# Altium footprint library MH_DA_THU_VIEN_16122016.PcbLib: 531 footprints (part 10 of 34)
Each footprint in its own frame and in the unit in brackets; x right, y up, seen from the top. Pads: shape width x height; smd on the part's side, far side on the other; paste and mask are expansions set on the pad; w line width, h text height; cw(c..) or ccw(c..) is an arc to the next point about the centre after c.
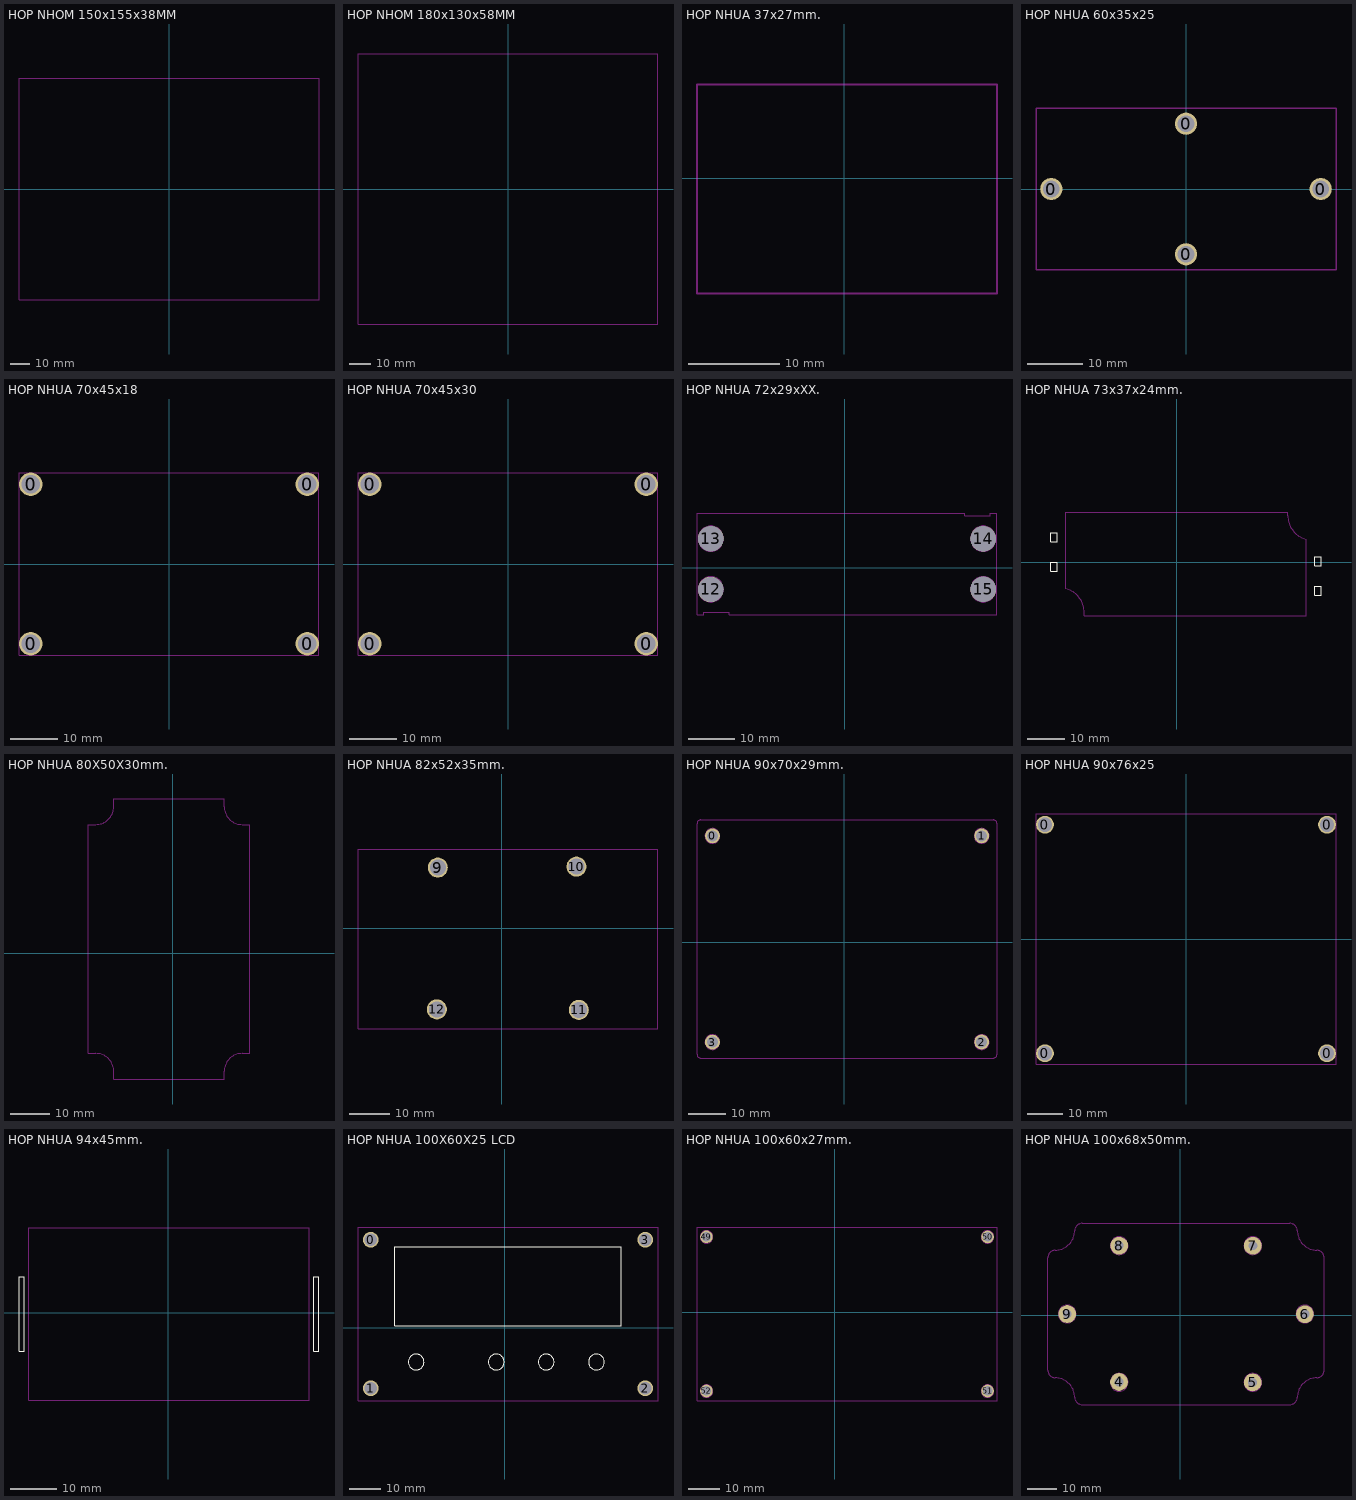
[diagram p9: the footprints below, top view; thin cyan lines are the x and y axes]

## HOP NHOM 150x155x38MM [mm]
Keep-Out Layer:
  lines w0.254: -76.5,-56.5 -76.5,56.5 76.5,56.5 76.5,-56.5 -76.5,-56.5

## HOP NHOM 180x130x58MM [mm]
Keep-Out Layer:
  lines w0.254: -71,-64 -71,64 71,64 71,-64 -71,-64

## HOP NHUA 37x27mm. [mm]
Keep-Out Layer:
  lines w0.254: -16.191,-12.659 16.809,-12.659 16.809,10.341 -16.191,10.341 -16.191,-12.659

## HOP NHUA 60x35x25 [mm]
pads (4):
  round 4 hole 3: 0(-24.25,0) 0(0,-11.75) 0(0,11.75) 0(24.25,0)
Keep-Out Layer:
  lines w0.254: -27,-14.5 -27,14.5 27,14.5 27,-14.5 -27,-14.5

## HOP NHUA 70x45x18 [mm]
pads (4):
  round 5 hole 4: 0(-29.5,-17) 0(-29.5,17) 0(29.5,-17) 0(29.5,17)
Keep-Out Layer:
  lines w0.254: -32,-19.5 -32,19.5 32,19.5 32,-19.5 -32,-19.5

## HOP NHUA 70x45x30 [mm]
pads (4):
  round 5 hole 4: 0(-29.5,-17) 0(-29.5,17) 0(29.5,-17) 0(29.5,17)
Keep-Out Layer:
  lines w0.254: -32,-19.5 32,-19.5 32,19.5 -32,19.5 -32,-19.5

## HOP NHUA 72x29xXX. [mm]
pads (4):
  round 5.5 hole 5.5: 12(-29.108,-4.699) 13(-29.058,6.325) 14(29.947,6.299) 15(29.972,-4.674)
Keep-Out Layer:
  circle w0.254: c29.947,-4.675 r2.75
  circle w0.254: c29.947,6.325 r2.75
  circle w0.254: c-29.053,-4.675 r2.75
  circle w0.254: c-29.053,6.325 r2.75
  lines w0.254: -32.053,-10.175 -32.053,11.825 25.947,11.825 25.947,11.325 31.447,11.325 31.447,11.825 32.947,11.825 32.947,-10.175 -25.053,-10.175 -25.053,-9.675 -30.553,-9.675 -30.553,-10.175 -32.053,-10.175

## HOP NHUA 73x37x24mm. [mm]
Top Overlay:
  lines w0.254: -33.979,-2.466 -32.179,-2.466 -32.179,0.034 -33.979,0.034 -33.979,-2.466 ; -33.979,5.534 -32.179,5.534 -32.179,8.034 -33.979,8.034 -33.979,5.534 ; 37.221,-8.966 39.021,-8.966 39.021,-6.466 37.221,-6.466 37.221,-8.966 ; 37.221,-0.966 39.021,-0.966 39.021,1.534 37.221,1.534 37.221,-0.966
Keep-Out Layer:
  lines w0.254: -29.979,-7.141 cw(c-31.479,-13.466) -24.979,-13.466 -24.979,-14.466 35.021,-14.466 35.021,6.21 cw(c36.521,12.534) 30.021,12.534 30.021,13.534 -29.979,13.534 -29.979,-7.141

## HOP NHUA 80X50X30mm. [mm]
Keep-Out Layer:
  lines w0.254: -14.959,37.705 cw(c-19.411,37.05) -19.411,32.55 -21.411,32.55 -21.411,30.05 -21.411,-22.95 -21.411,-25.45 -19.411,-25.45 cw(c-19.411,-29.95) -14.911,-29.95 -14.911,-31.95 -12.411,-31.95 10.589,-31.95 13.089,-31.95 13.089,-29.95 cw(c17.589,-29.95) 17.589,-25.45 19.589,-25.45 19.589,-22.95 19.589,30.05 19.589,32.55 17.589,32.55 cw(c17.589,37.05) 13.089,37.05 13.089,39.05 10.589,39.05 -12.411,39.05 -14.911,39.05 -14.911,37.05

## HOP NHUA 82x52x35mm. [mm]
pads (4):
  round 5 hole 4: 9(-15.951,15.189) 10(18.72,15.418) 11(19.304,-20.396) 12(-16.18,-20.269)
Keep-Out Layer:
  lines w0.254: -35.894,-25.168 39.106,-25.168 39.106,19.832 -35.894,19.832 -35.894,-25.168

## HOP NHUA 90x70x29mm. [mm]
pads (4):
  round 4 hole 3: 0(-35.357,28.575) 1(36.957,28.575) 2(36.957,-26.822) 3(-35.382,-26.848)
Keep-Out Layer:
  circle w0.254: c-35.394,28.563 r2
  circle w0.254: c36.956,28.563 r2
  circle w0.254: c-35.394,-26.837 r2
  circle w0.254: c36.956,-26.837 r2
  lines w0.254: -39.519,-30.137 ccw(c-38.519,-30.137) -38.519,-31.137 40.081,-31.137 ccw(c40.081,-30.137) 41.081,-30.137 41.081,31.863 ccw(c40.081,31.863) 40.081,32.863 -38.519,32.863 ccw(c-38.519,31.863) -39.519,31.863 -39.519,-30.137

## HOP NHUA 90x76x25 [mm]
pads (4):
  round 5 hole 4: 0(-39.5,-32) 0(-39.5,32) 0(39.5,-32) 0(39.5,32)
Keep-Out Layer:
  lines w0.254: -42,-35 42,-35 42,35 -42,35 -42,-35

## HOP NHUA 94x45mm. [mm]
Top Overlay:
  lines w0.254: -32.419,-8.405 -32.419,7.795 -31.319,7.795 -31.319,-8.405 -32.419,-8.405 ; 31.681,-8.405 31.681,7.795 32.781,7.795 32.781,-8.405 31.681,-8.405
Keep-Out Layer:
  lines w0.254: -30.319,-19.055 30.681,-19.055 30.681,18.445 -30.319,18.445 -30.319,-19.055

## HOP NHUA 100X60X25 LCD [mm]
pads (4):
  round 5 hole 4: 0(-42.393,27.838) 1(-42.367,-19.152) 2(44.552,-19.152) 3(44.577,27.864)
Top Overlay:
  circle w0.254: c-27.991,-10.868 r2.5
  circle w0.254: c-2.611,-10.868 r2.5
  circle w0.254: c29.089,-10.868 r2.5
  circle w0.254: c13.189,-10.868 r2.5
  lines w0.254: -34.749,0.539 -34.449,0.539 36.651,0.539 36.951,0.539 36.951,0.839 36.951,25.339 36.951,25.639 36.651,25.639 -34.449,25.639 -34.749,25.639 -34.749,25.339 -34.749,0.839 -34.749,0.539
Keep-Out Layer:
  lines w0.254: -46.399,-23.161 -46.399,31.839 48.601,31.839 48.601,-23.161 -46.399,-23.161

## HOP NHUA 100x60x27mm. [mm]
pads (4):
  round 4 hole 3: 49(-40.462,23.825) 50(48.311,23.8) 51(48.311,-24.841) 52(-40.462,-24.841)
Keep-Out Layer:
  circle w0.254: c-40.434,23.802 r2
  circle w0.254: c48.296,23.802 r2
  circle w0.254: c-40.434,-24.858 r2
  circle w0.254: c48.296,-24.858 r2
  lines w0.254: -43.434,-27.858 -43.434,26.802 51.296,26.802 51.296,-27.858 -43.434,-27.858

## HOP NHUA 100x68x50mm. [mm]
pads (6):
  round 6 hole 3: 4(-20.574,-22.53) 5(24.435,-22.657) 6(42.012,0.305) 7(24.486,23.343) 8(-20.523,23.368) 9(-37.998,0.356)
Keep-Out Layer:
  circle w0.254: c-20.519,23.361 r3
  circle w0.254: c-20.519,23.361 r1
  circle w0.254: c24.481,23.361 r3
  circle w0.254: c24.481,23.361 r1
  circle w0.254: c-20.519,-22.639 r3
  circle w0.254: c-20.519,-22.639 r1
  circle w0.254: c24.481,-22.639 r3
  circle w0.254: c24.481,-22.639 r1
  circle w0.254: c-38.019,0.361 r3
  circle w0.254: c-38.019,0.361 r1
  circle w0.254: c41.981,0.361 r3
  circle w0.254: c41.981,0.361 r1
  lines w0.254: -44.519,-18.639 ccw(c-42.019,-18.639) -42.019,-21.139 cw(c-42.019,-27.639) -35.519,-27.639 ccw(c-33.019,-27.639) -33.019,-30.139 36.981,-30.139 ccw(c36.981,-27.639) 39.481,-27.639 cw(c45.981,-27.639) 45.981,-21.139 ccw(c45.981,-18.639) 48.481,-18.639 48.481,19.361 ccw(c45.981,19.361) 45.981,21.861 cw(c45.981,28.361) 39.481,28.361 ccw(c36.981,28.361) 36.981,30.861 -33.019,30.861 ccw(c-33.019,28.361) -35.519,28.361 cw(c-42.019,28.361) -42.019,21.861 ccw(c-42.019,19.361) -44.519,19.361 -44.519,-18.639